# Altium schematic symbol library Altium_Lib.SchLib: 403 symbols (part 3 of 4)
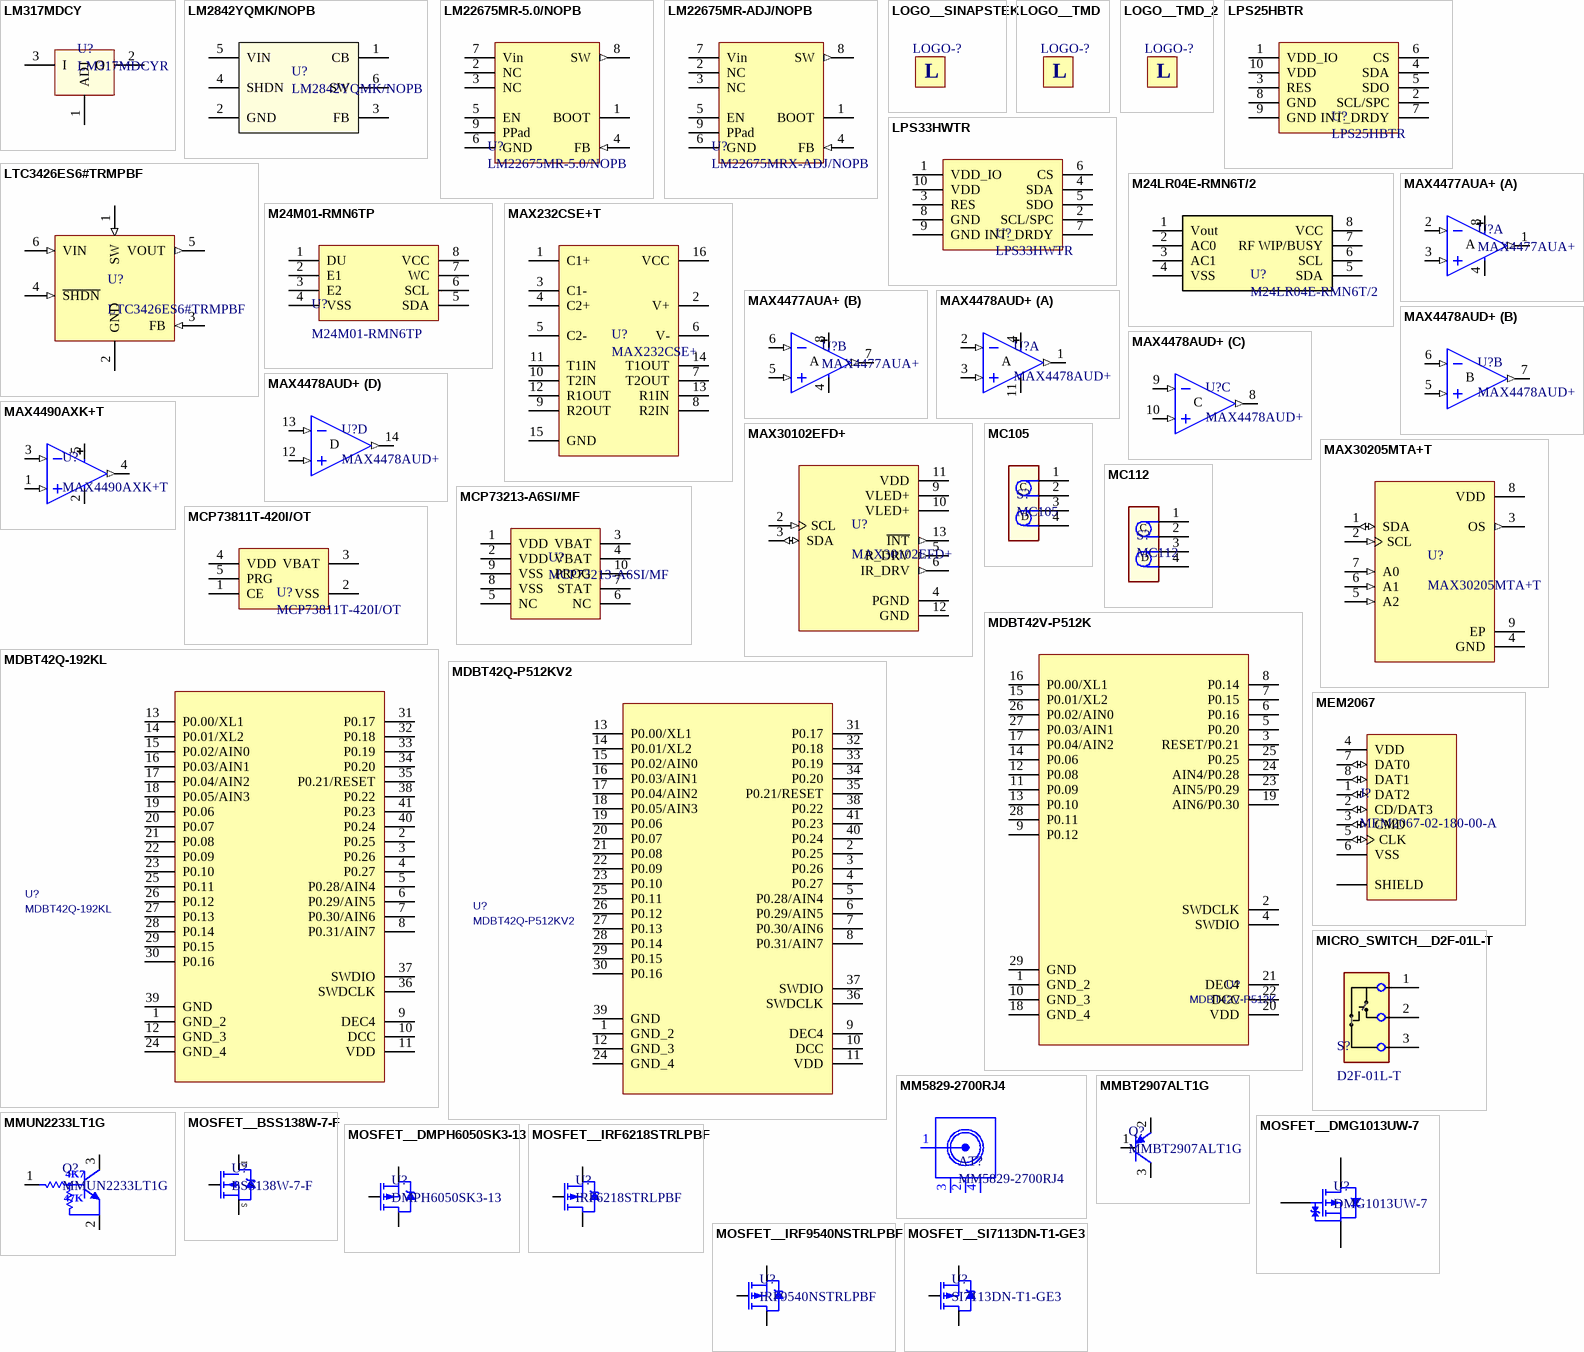
[diagram p13: symbols LM317MDCY to MOSFET__SI7113DN-T1-GE3]

## MAX30205MTA+T
designator U?
Clinical Grade Temperature Sensor Offers ±0.1°C (max) Accuracy for Thermometer Applications; Manufacturer: Maxim; Resolution: 16b; Output Type: I2C; Supplier 1: Digi-Key; Manufacturer Part Number: MAX30205MTA+T; RoHS: Yes; Category: Temperature and Humidity Sensors; Mount: Surface Mount; Min Operating Temperature: 0°C; Max Operating Temperature: 50°C; Packaging: Tape and Reel; ComponentLink1URL: https://datasheets.maximintegrated.com/en/ds/MAX30205.pdf?src-supplier=Digi-Key; ComponentLink1Description: Datasheet; Supplier Part Number 1: MAX30205MTA+T-ND
footprint TDFN-EP-8
pins: 1 SDA (io), 2 SCL (in), 3 OS (out), 4 GND (power), 5 A2 (in), 6 A1 (in), 7 A0 (in), 8 VDD (power), 9 EP (power)

## MC105
designator S?
Flammable Gas Sensor; Manufacturer: Winsen Sensor; Manufacturer Part Number: MC105; ComponentLink1Description: http://www.winsen-sensor.com/products/catalytic-gas-sensor-for-residential-application/mc105.html; Mounting Type: Through Hole
footprint Gas_Sensor__MC105
pins: 1 (power), 2 (power), 3 (power), 4 (power)
text: C; D

## MC112
designator S?
Catalytic Flammable Gas Sensor; Manufacturer: Winsen sensor; Manufacturer Part Number: MC112; Mounting Type: Through Hole; ComponentLink1Description: http://www.winsen-sensor.com/d/files/PDF/Catalytic%20Gas%20Sensor/Catalytic%20Gas%20Sensor%20For%20Industrial/MC112%20MC112C%20MC112D%20Manual%20(Ver1.3).pdf
footprint Gas_Sensor__MC112
pins: 1 (power), 2 (power), 3 (power), 4 (power)
text: C; D

## MCP73213-A6SI/MF
designator U?
IC LI-ION/LI-POLY CTRLR 10-DFN; Manufacturer: Microchip Technology; Battery Chemistry: Lithium-Ion/Polymer; Number of Cells: 2; Current - Charging: Constant - Programmable; Fault Protection: Over Voltage; Charge Current - Max: 1.1A; Battery Pack Voltage: 8.4V; Voltage - Supply (Max): 13V; Category: Integrated Circuits (ICs); Supplier: Digi-Key; Manufacturer Part Number: MCP73213-A6SI/MF; RoHS: RoHS Compliant; Packaging: Tube; Part Status: Active; Programmable Features: -; Interface: -; Operating Temperature: -40°C ~ 85°C (TA); Package / Case: 10-VFDFN Exposed Pad; Supplier Device Package: 10-DFN (3x3); ComponentLink1URL: http://www.microchip.com/mymicrochip/filehandler.aspx?ddocname=en544011; ComponentLink1Description: http://www.microchip.com/mymicrochip/filehandler.aspx?ddocname=en544011; Pricing: 1=1.88, 25=1.5644, 100=1.4175 (USD); Supplier Part Number: MCP73213-A6SI/MF-ND
footprint DFN-10__(3x3)
pins: 0 EP hidden to GND, 1 VDD, 2 VDD, 3 VBAT, 4 VBAT, 5 NC, 6 NC, 7 STAT, 8 VSS, 9 VSS, 10 PROG

## MCP73811T-420I/OT
designator U?
IC LI-ION/LI-POLY CTRLR SOT23-5; Manufacturer: Microchip Technology; Battery Chemistry: Lithium-Ion/Polymer; Number of Cells: 1; Charge Current - Max: 450mA; Battery Pack Voltage: 4.2V; Current - Charging: Constant; Voltage - Supply (Max): 6V; Manufacturer Part Number: MCP73811T-420I/OT; Category: Integrated Circuits (ICs); Supplier Device Package: SOT-23-5; Package / Case: SC-74A, SOT-753; Operating Temperature: -40°C ~ 85°C (TA); Fault Protection: -; Part Status: Active; Interface: -; RoHS: RoHS Compliant; Packaging: Tape & Reel (TR); Programmable Features: -; Supplier: Digi-Key; ComponentLink1URL: http://www.microchip.com/mymicrochip/filehandler.aspx?ddocname=en528273; ComponentLink1Description: http://www.microchip.com/mymicrochip/filehandler.aspx?ddocname=en528273; Pricing: 3000=0.4095 (USD); Supplier Part Number: MCP73811T-420I/OTTR-ND
footprint SOT23-5 (SOT-23/SC-74A; 5 Leads; Body 3 x 3 mm, inc. leads (LxW max))
pins: 1 CE, 2 VSS, 3 VBAT, 4 VDD, 5 PRG

## MDBT42Q-192KL
designator U?
MODULE BLUETOOTH BT5.1 & BT5 NRF52811 CHIP ANTENNA 192k Flash 24k Ram; Mfr_Name: Raytac Corporation; Value: MDBT42Q-192KL; Manufacturer_Part_Number: MDBT42Q-192KL
footprint MDBT42Q_RAY
pins: 1 GND_2, 2 P0.25, 3 P0.26, 4 P0.27, 5 P0.28/AIN4, 6 P0.29/AIN5, 7 P0.30/AIN6, 8 P0.31/AIN7, 9 DEC4, 10 DCC, 11 VDD, 12 GND_3, 13 P0.00/XL1, 14 P0.01/XL2, 15 P0.02/AIN0, 16 P0.03/AIN1, 17 P0.04/AIN2, 18 P0.05/AIN3, 19 P0.06, 20 P0.07, 21 P0.08, 22 P0.09, 23 P0.10, 24 GND_4, 25 P0.11, 26 P0.12, 27 P0.13, 28 P0.14, 29 P0.15, 30 P0.16, 31 P0.17, 32 P0.18, 33 P0.19, 34 P0.20, 35 P0.21/RESET, 36 SWDCLK, 37 SWDIO, 38 P0.22, 39 GND, 40 P0.24, 41 P0.23

## MDBT42Q-P512KV2
designator U?
MODULE BLUETOOTH BT5 MESH NRF52832 SOC PCB ANTENNA 512k Flash 64k RAM; Mfr_Name: Raytac Corporation; Value: MDBT42Q-P512KV2; Manufacturer_Part_Number: MDBT42Q-P512KV2
footprint MDBT42Q_RAY
pins: 1 GND_2, 2 P0.25, 3 P0.26, 4 P0.27, 5 P0.28/AIN4, 6 P0.29/AIN5, 7 P0.30/AIN6, 8 P0.31/AIN7, 9 DEC4, 10 DCC, 11 VDD, 12 GND_3, 13 P0.00/XL1, 14 P0.01/XL2, 15 P0.02/AIN0, 16 P0.03/AIN1, 17 P0.04/AIN2, 18 P0.05/AIN3, 19 P0.06, 20 P0.07, 21 P0.08, 22 P0.09, 23 P0.10, 24 GND_4, 25 P0.11, 26 P0.12, 27 P0.13, 28 P0.14, 29 P0.15, 30 P0.16, 31 P0.17, 32 P0.18, 33 P0.19, 34 P0.20, 35 P0.21/RESET, 36 SWDCLK, 37 SWDIO, 38 P0.22, 39 GND, 40 P0.24, 41 P0.23

## MDBT42V-P512K
designator U?
Nordic nRF52832 PCB Antenna Module / 512k Flash 64K RAM; Manufacturer: Raytac Corporation; C: Copyright (C) 2021 Accelerated Designs. All rights reserved; Value: MDBT42V-P512K; Copyright: Copyright (C) 2022 Ultra Librarian. All rights reserved.; Manufacturer Part Number: MDBT42V-P512K; ComponentLink1Description: Datasheet; ComponentLink1URL: https://cdn.ozdisan.com/ETicaret_Dosya/577039_371871.pdf
footprint MDBT42V-P512K
pins: 1 GND_2, 2 SWDCLK, 3 RESET/P0.21, 4 SWDIO, 5 P0.20, 6 P0.16, 7 P0.15, 8 P0.14, 9 P0.12, 10 GND_3, 11 P0.09, 12 P0.08, 13 P0.10, 14 P0.06, 15 P0.01/XL2, 16 P0.00/XL1, 17 P0.04/AIN2, 18 GND_4, 19 AIN6/P0.30, 20 VDD, 21 DEC4, 22 DCC, 23 AIN5/P0.29, 24 AIN4/P0.28, 25 P0.25, 26 P0.02/AIN0, 27 P0.03/AIN1, 28 P0.11, 29 GND

## MEM2067
designator J?, comment MEM2067-02-180-00-A
8 Contact Hinged SMT 1.8 mm Profile Micro SD Card (No Peg No Switch); MF: Global Connector Technology; Number of Contacts: 8; Package: None; Value: *; Price: None; MP: MEM2067-02-180-00-A; Availability: Unavailable; Supplier 1: Digi-Key; Manufacturer: Global Connector Technology; Manufacturer Part Number: MEM2067-02-180-00-A; RoHS: Yes; Category: Uncategorized; Stock 1: 16550; Pricing 1: 1=1,190000, 10=1,008000, 25=0,967200, 50=0,946600, 100=0,905500, 250=0,823200, 500=0,740880 (USD); Mount: Socket; Contact Material: Copper Alloy; Contact Plating: Gold; REACH SVHC: No SVHC; Lead Free: Lead Free; RoHS Compliant: Yes; ComponentLink1URL: http://www.farnell.com/datasheets/1876941.pdf?src-supplier=Farnell; ComponentLink1Description: http://www.farnell.com/datasheets/1876941.pdf?src-supplier=Farnell; ComponentLink2URL: http://www.farnell.com/datasheets/1876941.pdf?src-supplier=Element14; ComponentLink2Description: http://www.farnell.com/datasheets/1876941.pdf?src-supplier=Element14; Supplier Part Number 1: 2073-MEM2067-02-180-00-ACT-ND
footprint GCT_MEM2067-02-180-00-A_REVB
pins: 1 DAT2 (io), 2 CD/DAT3 (io), 3 CMD (io), 4 VDD (power), 5 CLK (io), 6 VSS (power), 7 DAT0 (io), 8 DAT1 (io), 9 SHIELD, 10 SHIELD, 11 SHIELD, 12 SHIELD

## MICRO_SWITCH__D2F-01L-T
designator S?, comment D2F-01L-T
SWITCH SNAP ACT SPDT 100MA 30V; Manufacturer: Omron Electronics; Actuator: Lever; Operating Force: 1.47 N; Switch Function: ON - (OFF), OFF - (ON); Voltage Rating DC: 30 VDC; Illuminated: Non-Illuminated; IP Rating: IP40; Supplier 1: Mouser; Manufacturer Part Number: D2F-01L-T; RoHS: RoHS Compliant; Category: Basic / Snap Action Switches; Stock 1: 1795; Pricing 1: 1=1.66, 10=1.57, 25=1.45, 100=1.38, 250=1.10, 500=1.00, 1000=0.977, 2000=0.945, 5000=0.882 (USD); Contact Form: SPDT; Current Rating: 100 mA; Illumination Color: -; Series: D2F; Termination Style: Solder Pin; Type: Ultra Subminiature; Voltage Rating AC: -; Brand: Omron Electronics; Contact Material: Gold Alloy; Lamp Type: -; Mounting Style: PCB Mount; Actuator Style: Lever; Maximum Operating Temperature: + 85 C; Minimum Operating Temperature: - 40 C; Product Type: Snap Action Switches; Standard Pack Qty: 1000; Subcategory: Switches; RoHS - Mouser: Y; Minimum Order Quantity: 1; Reeling: False; ComponentLink1URL: https://www.mouser.com/datasheet/2/307/en-d2f-587403.pdf; ComponentLink1Description: https://www.mouser.com/datasheet/2/307/en-d2f-587403.pdf; Supplier Part Number 1: 653-D2F-01L-T
footprint D2F-01L-T
pins: 1 COM, 2 NO, 3 NC

## MM5829-2700RJ4
designator AT?
CONN JSC RCPT STR 50 OHM SMD; Manufacturer: Murata Electronics North America; Impedance: 50 Ohm; Shield Termination: Solder; Connector Type: Receptacle, Female Socket; Insertion Loss: -; Mating Cycles: -; Center Contact Material: -; Operating Temperature: -40°C ~ 85°C; Dielectric Material: -; Center Contact Plating: -; Body Finish: -; Body Material: -; Includes: -; Ingress Protection: -; Housing Color: Gold; Features: -; Fastening Type: Snap-On; Cable Group: -; Mounting Feature: -; Mounting Type: Surface Mount; Contact Termination: Solder; Connector Style: JSC; Part Status: Active; Packaging: Tape & Reel (TR); RoHS: RoHS Compliant; Supplier: Digi-Key; Category: Connectors, Interconnects; Manufacturer Part Number: MM5829-2700RJ4; Pricing: 4000=0.10428, 8000=0.09164, 12000=0.08848, 28000=0.08532, 100000=0.08216 (USD); Supplier Part Number: 490-5894-2-ND
footprint CONN__JSC_RCPT__MM5829-2700RJ4
pins: 1, 2, 3 M1, 4 M2

## MMBT2907ALT1G
designator Q?
TRANS PNP 60V 0.6A SOT23; Manufacturer: ON Semiconductor; Current - Collector Cutoff (Max): 10nA (ICBO); Vce Saturation (Max) @ Ib, Ic: 1.6V @ 50mA, 500mA; DC Current Gain (hFE) (Min) @ Ic, Vce: 100 @ 150mA, 10V; Frequency - Transition: 200MHz; Transistor Type: PNP; Packaging: Tape & Reel (TR); Part Status: Active; RoHS: RoHS Compliant; Operating Temperature: -55°C ~ 150°C (TJ); Mounting Type: Surface Mount; Package / Case: TO-236-3, SC-59, SOT-23-3; Supplier Device Package: SOT-23-3 (TO-236); Base Part Number: MMBT2907A; Supplier: Digi-Key; Manufacturer Part Number: MMBT2907ALT1G; Category: Discrete Semiconductor Products; ComponentLink1URL: http://www.onsemi.com/pub/Collateral/MMBT2907ALT1-D.PDF; ComponentLink1Description: http://www.onsemi.com/pub/Collateral/MMBT2907ALT1-D.PDF; Pricing: 3000=0.01992, 6000=0.01796, 15000=0.01562, 30000=0.01406, 75000=0.0125, 150000=0.01039 (USD); Supplier Part Number: MMBT2907ALT1GOSTR-ND
footprint SOT23_L (SOT23, 3-Leads, Body 2.9x1.3mm, Pitch 0.95mm, Lead Span 2.3mm, IPC High Density)
pins: 1 B, 2 E, 3 C

## MMUN2233LT1G
designator Q?
TRANS PREBIAS NPN 246MW SOT23-3; Manufacturer: ON Semiconductor; Transistor Type: NPN - Pre-Biased; DC Current Gain (hFE) (Min) @ Ic, Vce: 80 @ 5mA, 10V; Vce Saturation (Max) @ Ib, Ic: 250mV @ 300µA, 10mA; Current - Collector Cutoff (Max): 500nA; Category: Discrete Semiconductor Products; Supplier: Digi-Key; Manufacturer Part Number: MMUN2233LT1G; RoHS: RoHS Compliant; Packaging: Tape & Reel (TR); Part Status: Active; Mounting Type: Surface Mount; Package / Case: TO-236-3, SC-59, SOT-23-3; Supplier Device Package: SOT-23-3 (TO-236); ComponentLink1URL: http://www.onsemi.com/pub/Collateral/DTC143Z-D.PDF; ComponentLink1Description: http://www.onsemi.com/pub/Collateral/DTC143Z-D.PDF; Pricing: 3000=0.02088, 6000=0.01884, 15000=0.01638, 30000=0.01474, 75000=0.0131, 150000=0.01092 (USD); Supplier Part Number: MMUN2233LT1GOSTR-ND
footprint SOT23_L (SOT23, 3-Leads, Body 2.9x1.3mm, Pitch 0.95mm, Lead Span 2.3mm, IPC High Density)
pins: 1 B, 2 E, 3 C
text: 4K7; 47K

## MOSFET__BSS138W-7-F
designator U?, comment BSS138W-7-F
Transistor MOSFET N Channel 50 Volt 0.2 Amp 3 Pin SOT-323 Tape And Reel; Manufacturer: Diodes; Continuous Drain Current (ID): 200mA; Nominal Vgs: 1.2V; Max Power Dissipation: 200mW; Drain to Source Voltage (Vdss): 50V; Gate to Source Voltage (Vgs): 20V; Rds On Max: 3.5R; Input Capacitance: 50pF; Number of Elements: 1; Drain to Source Breakdown Voltage: 75V; Drain to Source Resistance: 1.4R; Turn-Off Delay Time: 20ns; Element Configuration: Single; Polarity: N-CHANNEL; Supplier 1: Digi-Key; Manufacturer Part Number: BSS138W-7-F; RoHS: Yes; Category: MOSFETs; Stock 1: 1363167; Pricing 1: 1=0,33000, 10=0,26800, 100=0,14230, 500=0,09364, 1000=0,06367 (USD); Mount: Surface Mount; Case/Package: SOT-323; Number of Pins: 3; Weight: 0.000212oz; Contact Plating: Tin,Matte; Min Operating Temperature: -55°C; Max Operating Temperature: 150°C; Threshold Voltage: 1.2V; Packaging: Tape and Reel; Package Quantity: 3000; Dual Supply Voltage: 50V; Power Dissipation: 200mW; Turn-On Delay Time: 20ns; Termination: SMD/SMT; Number of Channels: 1; Voltage Rating (DC): 50V; Current Rating: 200mA; Voltage: 50V; On-State Resistance: 3.5R; Series: -; Drain-source On Resistance-Max: 3.5R; Length: 2.2mm; Width: 1.35mm; Height: 1mm; REACH SVHC: No SVHC; Lead Free: Lead Free; RoHS Compliant: Yes; ComponentLink1URL: https://datasheet.ciiva.com/19479/1589937-19479882.pdf?src-supplier=Jameco; ComponentLink1Description: https://datasheet.ciiva.com/19479/1589937-19479882.pdf?src-supplier=Jameco; ComponentLink2URL: https://datasheet.ciiva.com/4442/ds30206-79208-4442805.pdf?src-supplier=Mouser; ComponentLink2Description: https://datasheet.ciiva.com/4442/ds30206-79208-4442805.pdf?src-supplier=Mouser; ComponentLink3URL: https://datasheet.ciiva.com/8115/ds30206-8115376.pdf?src-supplier=Avnet; ComponentLink3Description: https://datasheet.ciiva.com/8115/ds30206-8115376.pdf?src-supplier=Avnet; ComponentLink4URL: https://datasheet.ciiva.com/17099/bss138w-7-f-17099411.pdf?src-supplier=Allied+Electronics; ComponentLink4Description: https://datasheet.ciiva.com/17099/bss138w-7-f-17099411.pdf?src-supplier=Allied+Electronics; ComponentLink5URL: https://datasheet.ciiva.com/1190/ds30206-1190191.pdf?src-supplier=Element14; ComponentLink5Description: https://datasheet.ciiva.com/1190/ds30206-1190191.pdf?src-supplier=Element14; ComponentLink6URL: https://datasheet.ciiva.com/8115/ds30206-8115303.pdf?src-supplier=Avnet; ComponentLink6Description: https://datasheet.ciiva.com/8115/ds30206-8115303.pdf?src-supplier=Avnet; ComponentLink7URL: https://datasheet.ciiva.com/941/ds30206-941177.pdf?src-supplier=Digi-Key; ComponentLink7Description: https://datasheet.ciiva.com/941/ds30206-941177.pdf?src-supplier=Digi-Key; ComponentLink8URL: https://datasheet.ciiva.com/6383/ds30206-6383772.pdf?src-supplier=Digi-Key; ComponentLink8Description: https://datasheet.ciiva.com/6383/ds30206-6383772.pdf?src-supplier=Digi-Key; Supplier Part Number 1: BSS138W-FDICT-ND
footprint SOT323
pins: 1 G, 2 S, 3 D

## MOSFET__DMG1013UW-7
designator U?, comment DMG1013UW-7
MOSFET P-CH 20V 820MA SOT323; Manufacturer: Diodes Incorporated; Vgs (Max): ±6V; Current - Continuous Drain (Id) @ 25°C: 820mA (Ta); Drive Voltage (Max Rds On,  Min Rds On): 1.8V, 4.5V; Rds On (Max) @ Id, Vgs: 750 mOhm @ 430mA, 4.5V; Power Dissipation (Max): 310mW (Ta); FET Type: P-Channel; Vgs(th) (Max) @ Id: 1V @ 250µA; Packaging: Cut Tape (CT); Supplier: Digi-Key; Supplier Device Package: SOT-323; FET Feature: -; Mounting Type: Surface Mount; Part Status: Active; Category: Discrete Semiconductor Products; Package / Case: SC-70, SOT-323; RoHS: RoHS Compliant; Manufacturer Part Number: DMG1013UW-7; Technology: MOSFET (Metal Oxide); Operating Temperature: -55°C ~ 150°C (TJ); ComponentLink1URL: https://www.diodes.com/assets/Datasheets/ds31861.pdf; ComponentLink1Description: https://www.diodes.com/assets/Datasheets/ds31861.pdf; Pricing: 1=0.41, 10=0.37, 100=0.2073, 500=0.11104, 1000=0.07551 (USD); Supplier Part Number: DMG1013UW-7DICT-ND
footprint SOT323
pins: 1 G, 2 S, 3 D

## MOSFET__DMPH6050SK3-13
designator U?, comment DMPH6050SK3-13
MOSFET P-CH 60V 7.2A DPAK; Manufacturer: Diodes Incorporated; Vgs (Max): ±20V; Power Dissipation (Max): 1.9W (Ta); Drive Voltage (Max Rds On,  Min Rds On): 4.5V, 10V; Current - Continuous Drain (Id) @ 25°C: 7.2A (Ta), 23.6A (Tc); FET Type: P-Channel; Rds On (Max) @ Id, Vgs: 50 mOhm @ 7A, 10V; Vgs(th) (Max) @ Id: 3V @ 250µA; FET Feature: -; Supplier Device Package: TO-252, (D-Pak); Manufacturer Part Number: DMPH6050SK3-13; RoHS: RoHS Compliant; Technology: MOSFET (Metal Oxide); Package / Case: TO-252-3, DPak (2 Leads + Tab), SC-63; Mounting Type: Surface Mount; Part Status: Active; Packaging: Cut Tape (CT); Category: Discrete Semiconductor Products; Supplier: Digi-Key; Operating Temperature: -55°C ~ 175°C (TJ); ComponentLink1URL: https://www.diodes.com/assets/Datasheets/DMPH6050SK3.pdf; ComponentLink1Description: https://www.diodes.com/assets/Datasheets/DMPH6050SK3.pdf; Pricing: 1=0.77, 10=0.674, 100=0.5197, 500=0.38498, 1000=0.30798 (USD); Supplier Part Number: DMPH6050SK3-13DICT-ND
footprint TO-252-3
pins: 1 G, 2 D, 3 S

## MOSFET__IRF6218STRLPBF
designator U?, comment IRF6218STRLPBF
MOSFET P-CH 150V 27A D2PAK; Manufacturer: Infineon Technologies; Drive Voltage (Max Rds On,  Min Rds On): 10V; Vgs(th) (Max) @ Id: 5V @ 250µA; FET Type: P-Channel; Current - Continuous Drain (Id) @ 25°C: 27A (Tc); Vgs (Max): ±20V; Rds On (Max) @ Id, Vgs: 150 mOhm @ 16A, 10V; Power Dissipation (Max): 250W (Tc); Operating Temperature: -55°C ~ 175°C (TJ); Mounting Type: Surface Mount; RoHS: RoHS Compliant; Supplier Device Package: D2PAK; Package / Case: TO-263-3, D²Pak (2 Leads + Tab), TO-263AB; Supplier: Digi-Key; Part Status: Active; Category: Discrete Semiconductor Products; Packaging: Tape & Reel (TR); Technology: MOSFET (Metal Oxide); Manufacturer Part Number: IRF6218STRLPBF; FET Feature: -; ComponentLink1URL: https://www.infineon.com/dgdl/irf6218spbf.pdf?fileId=5546d462533600a4015355e79f5e19e2; ComponentLink1Description: https://www.infineon.com/dgdl/irf6218spbf.pdf?fileId=5546d462533600a4015355e79f5e19e2; Supplier Part Number: IRF6218STRLPBFTR-ND
footprint D2PAK
pins: 1 G, 2 D, 3 S

## MOSFET__IRF9540NSTRLPBF
designator U?, comment IRF9540NSTRLPBF
MOSFET P-CH 100V 23A D2PAK; Manufacturer: Infineon Technologies; Power Dissipation (Max): 3.1W (Ta), 110W (Tc); Vgs (Max): ±20V; Vgs(th) (Max) @ Id: 4V @ 250µA; Drive Voltage (Max Rds On,  Min Rds On): 10V; Current - Continuous Drain (Id) @ 25°C: 23A (Tc); FET Type: P-Channel; Rds On (Max) @ Id, Vgs: 117 mOhm @ 14A, 10V; Category: Discrete Semiconductor Products; Supplier: Digi-Key; Manufacturer Part Number: IRF9540NSTRLPBF; Packaging: Cut Tape (CT); Package / Case: TO-263-3, D²Pak (2 Leads + Tab), TO-263AB; Operating Temperature: -55°C ~ 150°C (TJ); Supplier Device Package: D2PAK; FET Feature: -; Technology: MOSFET (Metal Oxide); Part Status: Active; RoHS: RoHS Compliant; Mounting Type: Surface Mount; ComponentLink1URL: https://www.infineon.com/dgdl/irf9540nspbf.pdf?fileId=5546d462533600a401535611d92a1dca; ComponentLink1Description: https://www.infineon.com/dgdl/irf9540nspbf.pdf?fileId=5546d462533600a401535611d92a1dca; Pricing: 1=1.82, 10=1.614, 100=1.2755 (USD); Supplier Part Number: IRF9540NSTRLPBFCT-ND
footprint D2PAK
pins: 1 G, 2 D, 3 S

## MOSFET__SI7113DN-T1-GE3
designator U?, comment SI7113DN-T1-GE3
MOSFET P-CH 100V 13.2A 1212-8; Manufacturer: Vishay Siliconix; Vgs (Max): ±20V; FET Type: P-Channel; Current - Continuous Drain (Id) @ 25°C: 13.2A (Tc); Drive Voltage (Max Rds On,  Min Rds On): 4.5V, 10V; Power Dissipation (Max): 3.7W (Ta), 52W (Tc); Rds On (Max) @ Id, Vgs: 134 mOhm @ 4A, 10V; Input Capacitance (Ciss) (Max) @ Vds: 1480pF @ 50V; Gate Charge (Qg) (Max) @ Vgs: 55nC @ 10V; Vgs(th) (Max) @ Id: 3V @ 250µA; Packaging: Tape & Reel (TR); Operating Temperature: -50°C ~ 150°C (TJ); Manufacturer Part Number: SI7113DN-T1-GE3; RoHS: RoHS Compliant; Part Status: Active; Supplier: Digi-Key; Drain to Source Voltage (Vdss): 100V; Package / Case: PowerPAK® 1212-8; Technology: MOSFET (Metal Oxide); FET Feature: -; Category: Discrete Semiconductor Products; Mounting Type: Surface Mount; Supplier Device Package: PowerPAK® 1212-8; ComponentLink1URL: http://www.vishay.com/docs/73770/si7113dn.pdf; ComponentLink1Description: http://www.vishay.com/docs/73770/si7113dn.pdf; Pricing: 3000=0.672, 6000=0.6384, 15000=0.6144 (USD); Supplier Part Number: SI7113DN-T1-GE3TR-ND
footprint PowerPAK_1212_8
pins: 1 S, 2 S, 3 S, 4 G, 5 D, 6 D, 7 D, 8 D

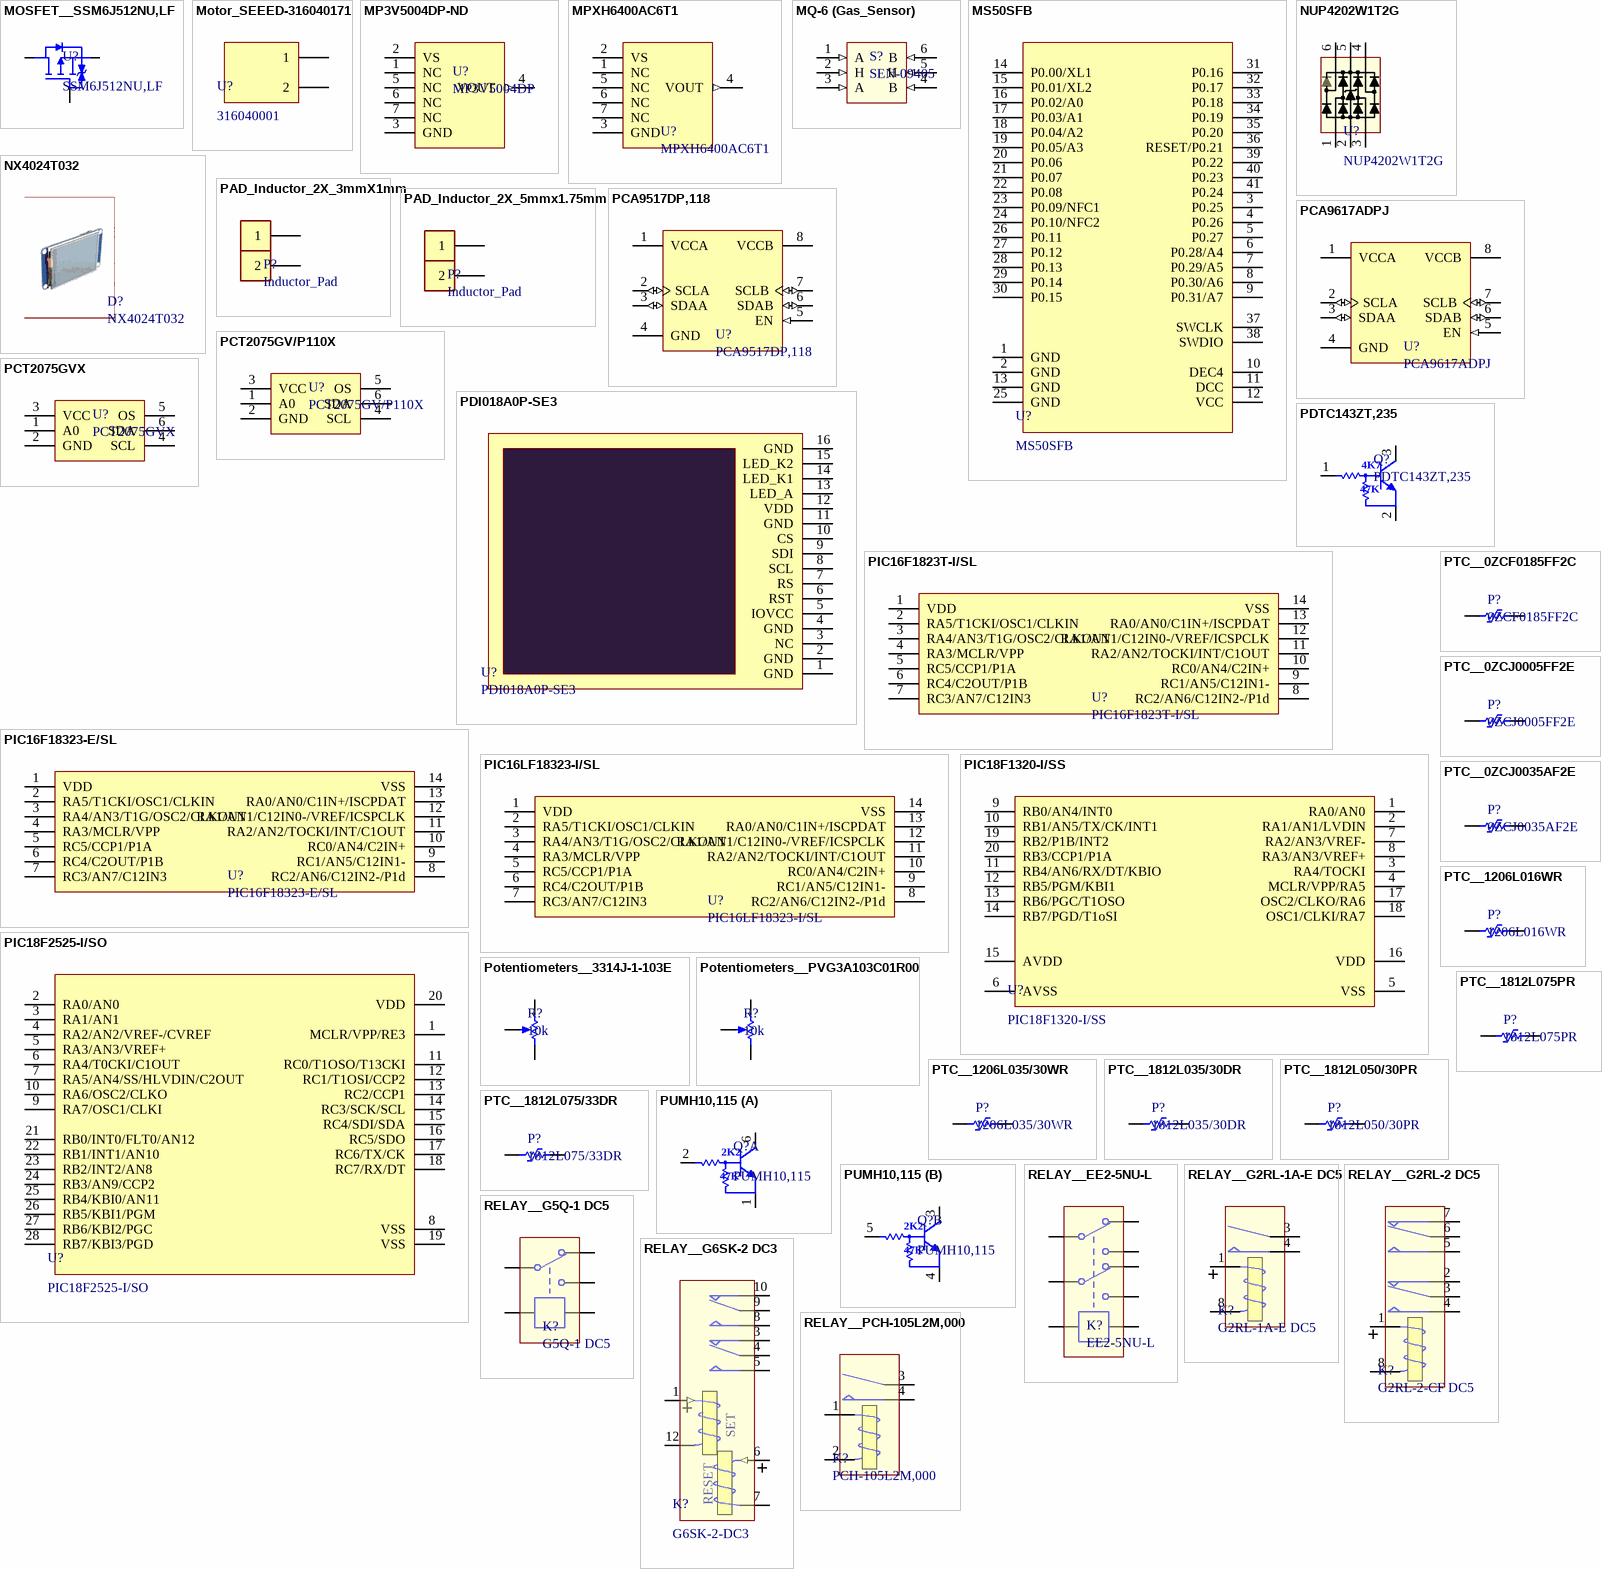
[diagram p7: symbols MOSFET__SSM6J512NU,LF to RELAY__PCH-105L2M,000]

## MOSFET__SSM6J512NU,LF
designator U?, comment SSM6J512NU,LF
MOSFET P-CH 12V 10A 6UDFNB; Manufacturer: Toshiba; Rds On Max: 16.2mR; Input Capacitance: 1.4nF; Max Power Dissipation: 1.25W; Supplier 1: Avnet; Manufacturer Part Number: SSM6J512NU,LF; Stock 1: 0; Pricing 1: 3000=0.1209, 6000=0.1177, 12000=0.1122, 18000=0.109, 24000=0.1067, 30000=0.1035, 300000=0.1011 (USD); Mount: Surface Mount; Packaging: Tape and Reel; Drain to Source Voltage (Vdss): 12V; Continuous Drain Current (ID): 10A; ComponentLink1URL: http://www.mouser.com/ds/2/408/SSM6J512NU_datasheet_en_20150903-805986.pdf?src-supplier=Mouser; ComponentLink1Description: http://www.mouser.com/ds/2/408/SSM6J512NU_datasheet_en_20150903-805986.pdf?src-supplier=Mouser; ComponentLink2URL: http://toshiba.semicon-storage.com/info/docget.jsp?did=30386&prodName=SSM6J512NU&src-supplier=Digi-Key; ComponentLink2Description: http://toshiba.semicon-storage.com/info/docget.jsp?did=30386&prodName=SSM6J512NU&src-supplier=Digi-Key; Supplier Part Number 1: SSM6J512NU,LF
footprint U-DFN2020-6
pins: 1 D, 2 D, 3 G, 4 S, 5 D, 6 D

## Motor_SEEED-316040171
designator U?, comment 316040001
Brushed DC Motors Cylindrical Body 3V 1Shaft; Manufacturer: Seeed Studio; Supplier 1: Digi-Key; Manufacturer Part Number: 316040001; RoHS: No; Category: Motors and Drives; Stock 1: 4652; Pricing 1: 1=1,20000 (USD); Min Operating Temperature: -20°C; Max Operating Temperature: 70°C; Termination: Wire Leads; ComponentLink1URL: https://media.digikey.com/pdf/Data%20Sheets/Seeed%20Technology/1020-15-003-001_Spec.pdf?src-supplier=Digi-Key; ComponentLink1Description: https://media.digikey.com/pdf/Data%20Sheets/Seeed%20Technology/1020-15-003-001_Spec.pdf?src-supplier=Digi-Key; Supplier Part Number 1: 1597-1244-ND
footprint Motor_SEEED-316040171
pins: 1, 2

## MP3V5004DP-ND
designator U?, comment MP3V5004DP
IC PRESSURE SENSOR 8-SOP; Manufacturer: NXP USA Inc.; Accuracy: ±2.5%; Operating Pressure: 0.57 PSI (3.92 kPa); Maximum Pressure: 2.32 PSI (16 kPa); Output: 0.6 V ~ 3 V; Output Type: Analog Voltage; Port Size: Male - 0.13" (3.3mm) Tube, Dual; Port Style: Barbed; Pressure Type: Differential; Voltage - Supply: 2.7 V ~ 3.3 V; Category: Sensors, Transducers; Features: Temperature Compensated; Manufacturer Part Number: MP3V5004DP; Operating Temperature: 0°C ~ 85°C; Package / Case: 8-BSOP (0.475", 12.06mm Width) Dual Ports, Same Side; Part Status: Active; RoHS: RoHS Compliant; Supplier: Digi-Key; Supplier Device Package: -; Termination Style: PCB; ComponentLink1URL: http://cache.freescale.com/files/sensors/doc/data_sheet/MP3V5004G.pdf; ComponentLink1Description: http://cache.freescale.com/files/sensors/doc/data_sheet/MP3V5004G.pdf; Pricing: 1=11.69, 5=10.25, 10=9.225, 25=8.2, 50=7.585, 100=7.08 (USD); Supplier Part Number: MP3V5004DP-ND
footprint BSOP_8_PS (8-BSOP (0.475", 12.06mm Width) Dual Ports, Same Side)
pins: 1 NC, 2 VS (power), 3 GND (power), 4 VOUT (out), 5 NC, 6 NC, 7 NC

## MPXH6400AC6T1
designator U?
SENSOR ABS PRESS 58PSI MAX; Manufacturer: NXP USA Inc.; Pressure Type: Absolute; Operating Pressure: 2.9 PSI ~ 58.02 PSI (20 kPa ~ 400 kPa); Output Type: Analog Voltage; Output: 0.2 V ~ 4.8 V; Accuracy: ±1.5%; Voltage - Supply: 4.64 V ~ 5.36 V; Port Size: Male - 0.13" (3.3mm) Tube; Port Style: Barbless; Maximum Pressure: 232.06 PSI (1600 kPa); Category: Sensors, Transducers; Supplier: Digi-Key; Manufacturer Part Number: MPXH6400AC6T1; RoHS: RoHS Compliant; Part Status: Active; Features: Temperature Compensated; Termination Style: PCB; Operating Temperature: -40°C ~ 125°C; Package / Case: 8-SSOP (0.335", 8.50mm Width), Top Port; Supplier Device Package: 8-SSOP; ComponentLink1URL: http://www.nxp.com/assets/documents/data/en/data-sheets/MPXH6400A.pdf; ComponentLink1Description: http://www.nxp.com/assets/documents/data/en/data-sheets/MPXH6400A.pdf; Pricing: 300=5.983, 600=5.79, 900=5.1338 (USD); Supplier Part Number: MPXH6400AC6T1TR-ND
footprint P-SSOP
pins: 1 NC, 2 VS (power), 3 GND (power), 4 VOUT (out), 5 NC, 6 NC, 7 NC

## MQ-6 (Gas_Sensor)
designator S?, comment SEN-09405
LPG GAS SENSOR - MQ-6; Manufacturer: SparkFun Electronics; Manufacturer Part Number: SEN-09405; RoHS: RoHS Compliant; Category: Sensors, Transducers; Part Status: Active; Supplier: Digi-Key; ComponentLink1URL: https://cdn.sparkfun.com/datasheets/Sensors/Biometric/MQ-6%20Ver1.3%20-%20Manual.pdf; ComponentLink1Description: https://cdn.sparkfun.com/datasheets/Sensors/Biometric/MQ-6%20Ver1.3%20-%20Manual.pdf; Pricing: 1=4.95 (USD); Supplier Part Number: 1568-1411-ND
footprint MQ-X (MQ-X Type Gas Sensor)
pins: 1 A (in), 2 H (in), 3 A (in), 4 B (in), 5 H (in), 6 B (in)

## MS50SFB
designator U?
Bluetooth 5.0 module; Manufacturer: MINEV; Manufacturer Part Number: MS50SFB
footprint MS50SFB (Respect stay away lines if not model 3)
pins: 1 GND, 2 GND, 3 P0.25, 4 P0.26, 5 P0.27, 6 P0.28/A4, 7 P0.29/A5, 8 P0.30/A6, 9 P0.31/A7, 10 DEC4, 11 DCC, 12 VCC, 13 GND, 14 P0.00/XL1, 15 P0.01/XL2, 16 P0.02/A0, 17 P0.03/A1, 18 P0.04/A2, 19 P0.05/A3, 20 P0.06, 21 P0.07, 22 P0.08, 23 P0.09/NFC1, 24 P0.10/NFC2, 25 GND, 26 P0.11, 27 P0.12, 28 P0.13, 29 P0.14, 30 P0.15, 31 P0.16, 32 P0.17, 33 P0.18, 34 P0.19, 35 P0.20, 36 RESET/P0.21, 37 SWCLK, 38 SWDIO, 39 P0.22, 40 P0.23, 41 P0.24

## NUP4202W1T2G
designator U?